# Altium footprint library FOOTPRINT.PcbLib: 132 footprints (part 1 of 9)
Each footprint in its own frame and in the unit in brackets; x right, y up, seen from the top. Pads: shape width x height; smd on the part's side, far side on the other; paste and mask are expansions set on the pad; w line width, h text height; cw(c..) or ccw(c..) is an arc to the next point about the centre after c.
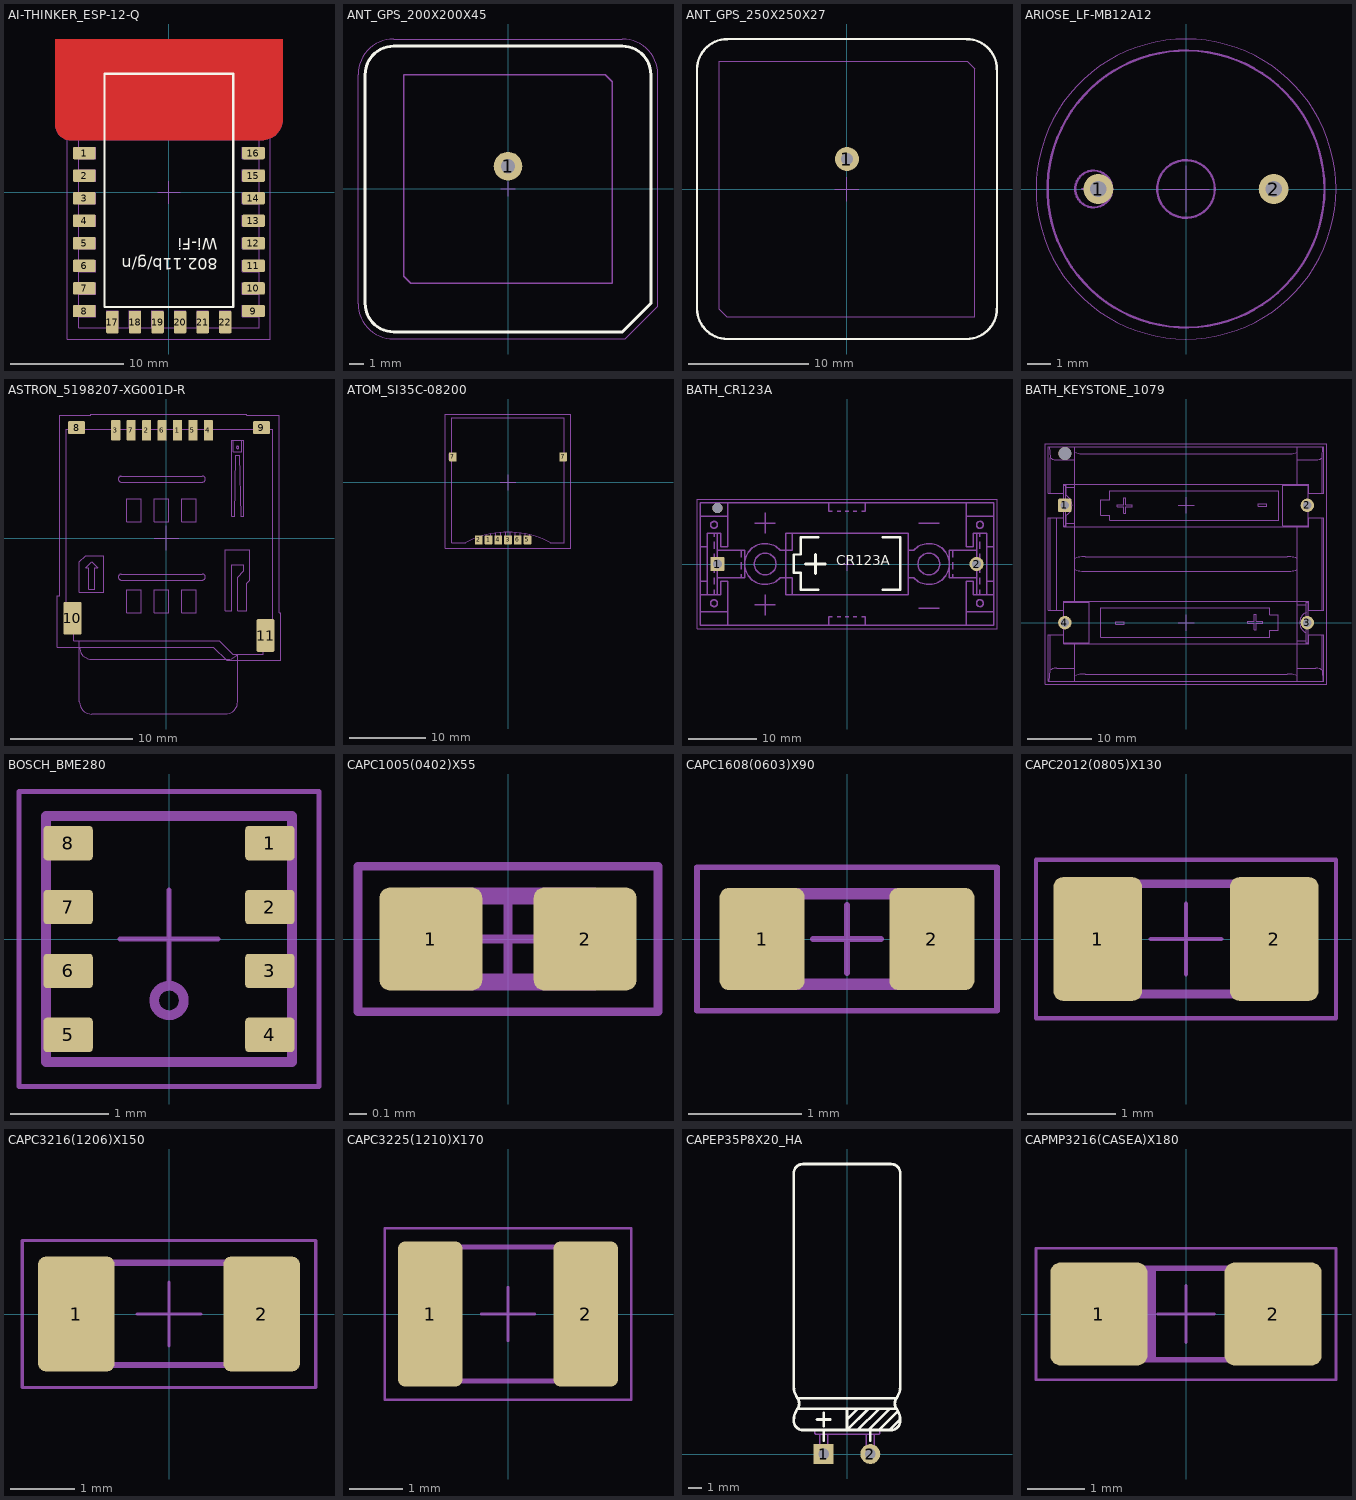
[diagram p0: the footprints below, top view; thin cyan lines are the x and y axes]

## AI-THINKER_ESP-12-Q [mm] "WiFi Module"
height 3.4
pads (22):
  rrect20% 2x1.1 smd: 1(-7.5,3.48) 2(-7.5,1.48) 3(-7.5,-0.52) 4(-7.5,-2.52) 5(-7.5,-4.52) 6(-7.5,-6.52) 7(-7.5,-8.52) 8(-7.5,-10.52) 9(7.5,-10.52) 10(7.5,-8.52) 11(7.5,-6.52) 12(7.5,-4.52) 13(7.5,-2.52) 14(7.5,-0.52) 15(7.5,1.48) 16(7.5,3.48)
  rrect20% 1.1x2 smd: 17(-5,-11.5) 18(-3,-11.5) 19(-1,-11.5) 20(1,-11.5) 21(3,-11.5) 22(5,-11.5)
Top:
  pour cut-out: -10.05,5.937 -10.05,13.587 10.075,13.587 10.075,6.449 10.075,6.27 10.005,5.917 9.867,5.585 9.668,5.286 9.413,5.032 9.114,4.832 8.782,4.695 8.43,4.624 8.25,4.624 -8.737,4.624 -8.867,4.624 -9.12,4.675 -9.359,4.774 -9.574,4.918 -9.757,5.1 -9.901,5.315 -10,5.554 -10.05,5.808
Top Inner 2:
  pour cut-out: -10.05,5.937 -10.05,13.587 10.075,13.587 10.075,6.449 10.075,6.27 10.005,5.917 9.867,5.585 9.668,5.286 9.413,5.032 9.114,4.832 8.782,4.695 8.43,4.624 8.25,4.624 -8.737,4.624 -8.867,4.624 -9.12,4.675 -9.359,4.774 -9.574,4.918 -9.757,5.1 -9.901,5.315 -10,5.554 -10.05,5.808
Top Inner 1:
  pour cut-out: -10.05,5.937 -10.05,13.587 10.075,13.587 10.075,6.449 10.075,6.27 10.005,5.917 9.867,5.585 9.668,5.286 9.413,5.032 9.114,4.832 8.782,4.695 8.43,4.624 8.25,4.624 -8.737,4.624 -8.867,4.624 -9.12,4.675 -9.359,4.774 -9.574,4.918 -9.757,5.1 -9.901,5.315 -10,5.554 -10.05,5.808
Bot Inner 2:
  pour cut-out: -10.05,5.937 -10.05,13.587 10.075,13.587 10.075,6.449 10.075,6.27 10.005,5.917 9.867,5.585 9.668,5.286 9.413,5.032 9.114,4.832 8.782,4.695 8.43,4.624 8.25,4.624 -8.737,4.624 -8.867,4.624 -9.12,4.675 -9.359,4.774 -9.574,4.918 -9.757,5.1 -9.901,5.315 -10,5.554 -10.05,5.808
Bot Inner 1:
  pour cut-out: -10.05,5.937 -10.05,13.587 10.075,13.587 10.075,6.449 10.075,6.27 10.005,5.917 9.867,5.585 9.668,5.286 9.413,5.032 9.114,4.832 8.782,4.695 8.43,4.624 8.25,4.624 -8.737,4.624 -8.867,4.624 -9.12,4.675 -9.359,4.774 -9.574,4.918 -9.757,5.1 -9.901,5.315 -10,5.554 -10.05,5.808
Bot:
  pour cut-out: -10.05,5.937 -10.05,13.587 10.075,13.587 10.075,6.449 10.075,6.27 10.005,5.917 9.867,5.585 9.668,5.286 9.413,5.032 9.114,4.832 8.782,4.695 8.43,4.624 8.25,4.624 -8.737,4.624 -8.867,4.624 -9.12,4.675 -9.359,4.774 -9.574,4.918 -9.757,5.1 -9.901,5.315 -10,5.554 -10.05,5.808
Top Overlay:
  lines w0.2: -5.7,-10.157 -5.7,10.518 5.7,10.518 5.7,-10.157 -5.7,-10.157
  text "802.11b/g/n / Wi-Fi" at 4.35,-3.707 h1.8
Top Assembly:
  lines w0.1: -8,-11.02 -6.5,-11.02 -6.5,-10.02 -8,-10.02 ; -8,-9.02 -6.5,-9.02 -6.5,-8.02 -8,-8.02 ; -8,-7.02 -6.5,-7.02 -6.5,-6.02 -8,-6.02 ; -8,-5.02 -6.5,-5.02 -6.5,-4.02 -8,-4.02 ; -8,-3.02 -6.5,-3.02 -6.5,-2.02 -8,-2.02 ; -8,-1.02 -6.5,-1.02 -6.5,-0.02 -8,-0.02 ; -8,0.98 -6.5,0.98 -6.5,1.98 -8,1.98 ; -8,2.98 -6.5,2.98 -6.5,3.98 -8,3.98 ; -8,5.775 8,5.775 ; -6.1,5.775 -6.1,9.875 -1.9,9.875 -1.9,7.875 -0.1,7.875 -0.1,9.875 2.1,9.875 2.1,7.875 3.9,7.875 3.9,9.875 6.1,9.875 6.1,6.775 5.9,6.775 ; -5.9,5.775 -5.9,9.675 -4.1,9.675 -4.1,5.775 ; -5.5,-12 -5.5,-10.5 -4.5,-10.5 -4.5,-12 ; -3.9,5.775 -3.9,9.675 -2.1,9.675 -2.1,7.675 0.1,7.675 0.1,9.675 1.9,9.675 1.9,7.675 4.1,7.675 4.1,9.675 5.9,9.675 5.9,6.775 ; -3.5,-12 -3.5,-10.5 -2.5,-10.5 -2.5,-12 ; -1.5,-12 -1.5,-10.5 -0.5,-10.5 -0.5,-12 ; 0.5,-12 0.5,-10.5 1.5,-10.5 1.5,-12 ; 2.5,-12 2.5,-10.5 3.5,-10.5 3.5,-12 ; 4.5,-12 4.5,-10.5 5.5,-10.5 5.5,-12 ; 5.3,-12.025 8,-12.025 8,-10.82 cw(c8,-10.52) 8,-10.22 8,-8.82 cw(c8,-8.52) 8,-8.22 8,-6.82 cw(c8,-6.52) 8,-6.22 8,-4.82 cw(c8,-4.52) 8,-4.22 8,-2.82 cw(c8,-2.52) 8,-2.22 8,-0.82 cw(c8,-0.52) 8,-0.22 8,1.18 cw(c8,1.48) 8,1.78 8,3.18 cw(c8,3.48) 8,3.78 8,11.975 -8,11.975 -8,3.78 cw(c-8,3.48) -8,3.18 -8,1.78 cw(c-8,1.48) -8,1.18 -8,-0.22 cw(c-8,-0.52) -8,-0.82 -8,-2.22 cw(c-8,-2.52) -8,-2.82 -8,-4.22 cw(c-8,-4.52) -8,-4.82 -8,-6.22 cw(c-8,-6.52) -8,-6.82 -8,-8.22 cw(c-8,-8.52) -8,-8.82 -8,-10.22 cw(c-8,-10.52) -8,-10.82 -8,-12.025 -5.3,-12.025 -5.3,-12 cw(c-5,-12) -4.7,-12 -3.3,-12 cw(c-3,-12) -2.7,-12 -1.3,-12 cw(c-1,-12) -0.7,-12 0.7,-12 cw(c1,-12) 1.3,-12 2.7,-12 cw(c3,-12) 3.3,-12 4.7,-12 cw(c5,-12) 5.3,-12 ; 8,-11.02 6.5,-11.02 6.5,-10.02 8,-10.02 ; 8,-9.02 6.5,-9.02 6.5,-8.02 8,-8.02 ; 8,-7.02 6.5,-7.02 6.5,-6.02 8,-6.02 ; 8,-5.02 6.5,-5.02 6.5,-4.02 8,-4.02 ; 8,-3.02 6.5,-3.02 6.5,-2.02 8,-2.02 ; 8,-1.02 6.5,-1.02 6.5,-0.02 8,-0.02 ; 8,0.98 6.5,0.98 6.5,1.98 8,1.98 ; 8,2.98 6.5,2.98 6.5,3.98 8,3.98 ; 5.9,6.775 5.9,6.775
Top Courtyard:
  lines w0.05: -9,-13 9,-13 9,12.475 -9,12.475 -9,-13
Top Component Center:
  lines w0.05: -1,0 1,0 ; 0,-1 0,1
Top Designator:
  text "'.Comment'" at -1.425,-0.81 h0.65
  text "'.Designator'" at -1.425,0.351 h0.65
3D body "MOD_ESP-12-Q.x_t": height 3.41, standoff 0.01, extent -8,-12.025 8,11.975

## ANT_GPS_200X200X45 [mm] "GPS-Antenna, Body 20x20mm"
height 4.5
pads (1):
  round 2 hole 1: 1(0,1.6)
Top Overlay:
  lines w0.2: -10,-8 ccw(c-8,-8) -8,-10 8,-10 10,-8 10,8 ccw(c8,8) 8,10 -8,10 ccw(c-8,8) -10,8 -10,-8
Top Assembly:
  lines w0.1: 8,-10 8,-10 ; 8,-10 10,-8 10,8 ccw(c8,8) 8,10 -8,10 ccw(c-8,8) -10,8 -10,-8 ccw(c-8,-8) -8,-10 8,-10 ; -7.3,-6.1 -6.8,-6.6 7.3,-6.6 7.3,7.5 6.8,8 -7.3,8 -7.3,-6.1
Top Courtyard:
  lines w0.05: -10.5,-8.025 ccw(c-8.012,-8.013) -8,-10.5 8.2,-10.5 10.5,-8.2 10.5,8 ccw(c8,8) 8,10.5 -8,10.5 ccw(c-8,8) -10.5,8 -10.5,-8.025
Top Component Center:
  lines w0.05: -0.5,0 0.5,0 ; 0,-0.5 0,0.5
Top Designator:
  text "'.Comment'" at -2.625,-0.502 h0.65
  text "'.Designator'" at -2.625,0.126 h0.65
3D body "ANT-GPS.x_t": height 4.5, standoff -2, extent -10,-10 10,10

## ANT_GPS_250X250X27 [mm] "GPS-Antenna, Body 25x25mm"
height 2.7
pads (1):
  round 2 hole 1: 1(0,2.5)
Top Overlay:
  lines w0.2: -9.975,12.495 ccw(c-9.975,9.975) -12.495,9.975 -12.495,-9.975 ccw(c-9.975,-9.975) -9.975,-12.495 9.975,-12.495 ccw(c9.975,-9.975) 12.495,-9.975 ; -9.975,12.5 9.975,12.5 ; 9.975,12.495 cw(c9.975,9.975) 12.495,9.975 ; 12.5,-9.975 12.5,9.975
Top Assembly:
  lines w0.1: -9.975,12.495 ccw(c-9.975,9.975) -12.495,9.975 -12.495,-9.975 ccw(c-9.975,-9.975) -9.975,-12.495 9.975,-12.495 ccw(c9.975,-9.975) 12.495,-9.975 ; -9.975,12.5 9.975,12.5 ; 9.975,12.495 cw(c9.975,9.975) 12.495,9.975 ; 12.5,-9.975 12.5,9.975 ; -10.65,-10.025 -10.65,10.65 10.025,10.65 10.65,10.025 10.65,-10.65 -10.025,-10.65 -10.65,-10.025
Top Component Center:
  lines w0.05: -1,0 1,0 ; 0,-1 0,1
Top Designator:
  text "'.Designator'" at -2.625,0.126 h0.65
  text "'.Comment'" at -2.625,-0.502 h0.65
3D body "ANT-GPS_250X250X27.x_t": height 2.7, standoff -2, extent -12.5,-12.5 12.5,12.5

## ARIOSE_LF-MB12A12 [mm] "Buzzer, D12mm, H7.5mm, Pitch 7.6mm, Lead D0.6mm"
height 7.5
pads (2):
  round 1.3 hole 0.7: 1(-3.8,0) 2(3.8,0)
Top Assembly:
  circle w0.1: c0,0 r6
  circle w0.1: c0,0 r1.25
  circle w0.1: c-4,0 r0.8
  lines w0.1: -4.5,0 -3.5,0 ; -4,-0.5 -4,0.5
Top Courtyard:
  circle w0.05: c0,0 r6.5
Top Component Center:
  lines w0.05: -1,0 1,0 ; 0,-1 0,1
Top Designator:
  text "'.Comment'" at -1.5,-0.452 h0.65
  text "'.Designator'" at -1.5,0.176 h0.65
3D body "ARIOSE_LF-MB12A12.x_t": height 7.51, standoff -2.49, extent -6,-6 6,6

## ASTRON_5198207-XG001D-R [mm] "Micro SIM SMT Holder"
height 1.75
pads (11):
  rrect20% 0.75x1.7 smd: 1(0.91,8.86) 2(-1.63,8.86) 3(-4.17,8.86) 4(3.45,8.86) 5(2.18,8.86) 6(-0.36,8.86) 7(-2.9,8.86)
  rrect20% 1.4x1.05 smd: 8(-7.39,9.08) 9(7.81,9.08)
  rrect20% 1.5x2.7 smd: 10(-7.72,-6.58) 11(8.14,-8)
Top Assembly:
  circle w0.1: c5.85,7.45 r0.1
  lines w0.1: -7.85,8.95 -7.85,9.15 cw(c-7.65,9.15) -7.45,9.15 -7.35,9.15 cw(c-7.15,9.15) -6.95,9.15 -6.95,8.95 ; -7.15,-9.95 -7.15,-8.45 -7.15,-13.45 ccw(c-6.15,-13.45) -6.15,-14.45 4.85,-14.45 ccw(c4.85,-13.45) 5.85,-13.45 5.85,-9.55 ; -7.15,-8.95 ccw(c-6.15,-8.95) -6.15,-9.95 5.15,-9.95 ; -4.4,8.99 -4.4,9.49 -4,9.49 -4,8.99 ; -3.75,5.1 2.95,5.1 cw(c2.95,4.85) 2.95,4.6 -3.7,4.6 cw(c-3.7,4.85) -3.7,5.1 ; -3.13,8.99 -3.13,9.49 -2.73,9.49 -2.73,8.99 ; -1.86,8.99 -1.86,9.49 -1.46,9.49 -1.46,8.99 ; -0.59,8.99 -0.59,9.49 -0.19,9.49 -0.19,8.99 ; 0.68,8.99 0.68,9.49 1.08,9.49 1.08,8.99 ; 1.95,8.99 1.95,9.49 2.35,9.49 2.35,8.99 ; 3.22,8.99 3.22,9.49 3.62,9.49 3.62,8.99 ; 5.05,-9.95 ccw(c5.05,-8.95) 5.85,-9.55 ; 5.5,8.05 5.5,7.1 6.2,7.1 6.2,8.05 ; 5.85,-9.95 5.85,-9.55 ; 7.35,8.95 7.35,9.15 cw(c7.55,9.15) 7.75,9.15 7.85,9.15 cw(c8.05,9.15) 8.25,9.15 8.25,8.95 ; -8.25,-5.55 -7.6,-5.55 -7.6,-5.95 -8.05,-5.95 -8.05,-7.55 -7.6,-7.55 -7.6,-8.45 4.35,-8.45 5.45,-9.55 7.95,-9.55 7.95,-7.45 8.75,-7.45 8.75,8.95 -8.25,8.95 -8.25,-5.55 ; -7.15,-4.45 -7.15,-1.95 -6.65,-1.45 -5.15,-1.45 -5.15,-4.45 -7.15,-4.45 ; -6.65,-2.45 -6.4,-2.45 -6.4,-4.2 -5.9,-4.2 -5.9,-2.45 -5.65,-2.45 -6.15,-1.95 -6.65,-2.45 ; -3.7,-3.45 cw(c-3.7,-3.2) -3.7,-2.95 2.95,-2.95 cw(c2.95,-3.2) 2.95,-3.45 -3.7,-3.45 ; -3.25,-6.15 -2.05,-6.15 -2.05,-4.25 -3.25,-4.25 -3.25,-6.15 ; -3.25,1.35 -2.05,1.35 -2.05,3.25 -3.25,3.25 -3.25,1.35 ; -1,-6.15 0.2,-6.15 0.2,-4.25 -1,-4.25 -1,-6.15 ; -1,1.35 0.2,1.35 0.2,3.25 -1,3.25 -1,1.35 ; 1.25,-6.15 2.45,-6.15 2.45,-4.25 1.25,-4.25 1.25,-6.15 ; 1.25,1.35 2.45,1.35 2.45,3.25 1.25,3.25 1.25,1.35 ; 4.85,-5.95 5.35,-5.95 5.35,-2.2 6.35,-2.2 6.35,-2.7 5.85,-3.2 5.85,-5.95 6.6,-5.95 6.6,-3.7 6.85,-3.45 6.85,-0.95 4.85,-0.95 4.85,-5.95 ; 5.35,1.8 5.6,1.8 5.7,6.8 6,6.8 6.1,1.8 6.35,1.8 6.35,8.05 5.35,8.05 5.35,1.8 ; 7.95,-9.05 7.95,-7.85 8.55,-7.85 cw(c8.55,-8.05) 8.55,-8.25 8.55,-8.65 cw(c8.55,-8.85) 8.55,-9.05 7.95,-9.05
Top Courtyard:
  lines w0.05: -8.975,-8.95 3.85,-8.95 4.95,-10.05 9.4,-10.05 9.4,-6.15 9.25,-6.15 9.25,10.1 6.6,10.1 6.6,10.2 -6.2,10.2 -6.2,10.1 -8.75,10.1 -8.75,-4.725 -8.975,-4.725 -8.975,-8.95
Top Component Center:
  lines w0.05: -1,0 1,0 ; 0,-1 0,1
Top Designator:
  text "'.Designator'" at -2.625,0.126 h0.65
  text "'.Comment'" at -2.625,-0.502 h0.65
3D body: height 2, standoff 0, extent -8.25,-9.55 8.75,8.95
3D body: height 0.16, standoff 0, extent -4.4,8.95 -4,9.49
3D body: height 0.16, standoff 0, extent -3.13,8.95 -2.73,9.49
3D body: height 0.16, standoff 0, extent -1.86,8.95 -1.46,9.49
3D body: height 0.16, standoff 0, extent -0.59,8.95 -0.19,9.49
3D body: height 0.16, standoff 0, extent 0.68,8.95 1.08,9.49
3D body: height 0.16, standoff 0, extent 1.95,8.95 2.35,9.49
3D body: height 0.16, standoff 0, extent 3.22,8.95 3.62,9.49
3D body: height 0.16, standoff 0, extent -7.85,8.95 -6.95,9.35
3D body: height 0.16, standoff 0, extent 7.35,8.95 8.25,9.35
3D body: height 0.16, standoff 0, extent 7.95,-9.05 8.75,-7.85

## ATOM_SI35C-08200 [mm] "Micro SIM Holder"
pads (8):
  rrect20% 1x1.2 smd: 1(-2.54,-7.5) 2(-3.81,-7.5) 3(0,-7.5) 4(-1.27,-7.5) 5(2.54,-7.5) 6(1.27,-7.5) 7(-7.2,3.35) 7(7.2,3.35)
Top Assembly:
  lines w0.1: -7.33,2.95 -7.65,2.95 -7.65,3.75 -7.33,3.75 ; -4.12,-7.237 -4.12,-7.85 -3.5,-7.85 -3.5,-7.05 ; -2.85,-6.847 -2.85,-7.85 -2.23,-7.85 -2.23,-6.711 ; -1.58,-6.606 -1.58,-7.85 -0.96,-7.85 -0.96,-6.539 ; -0.31,-6.504 -0.31,-7.85 0.31,-7.85 0.31,-6.504 ; 0.96,-6.539 0.96,-7.85 1.58,-7.85 1.58,-6.606 ; 2.23,-6.711 2.23,-7.85 2.85,-7.85 2.85,-6.847 ; 7.33,2.95 7.65,2.95 7.65,3.75 7.33,3.75 ; -7.33,-7.85 -5.5,-7.85 cw(c0,-18.379) 5.5,-7.85 7.33,-7.85 7.33,8.45 -7.33,8.45 -7.33,-7.85
Top Courtyard:
  lines w0.05: -8.2,-8.6 -4.5,-8.6 8.2,-8.6 8.2,3.3 8.2,8.95 -8.2,8.95 -8.2,2.7 -8.2,-8.6
Top Component Center:
  lines w0.05: -1,0 1,0 ; 0,-1 0,1
Top Designator:
  text "'.Comment'" at -1.425,-0.749 h0.65
  text "'.Designator'" at -1.425,0.351 h0.65
3D body: height 0.25, standoff 0, extent 7.33,2.95 7.65,3.75
3D body: height 0.25, standoff 0, extent -7.65,2.95 -7.33,3.75
3D body: height 0.25, standoff 0, extent 2.23,-7.85 2.85,-6.711
3D body: height 0.25, standoff 0, extent 0.96,-7.85 1.58,-6.548
3D body: height 0.25, standoff 0, extent -0.31,-7.85 0.31,-6.504
3D body: height 0.25, standoff 0, extent -1.58,-7.85 -0.96,-6.548
3D body: height 0.25, standoff 0, extent -2.85,-7.85 -2.23,-6.711
3D body: height 0.25, standoff 0, extent -4.12,-7.85 -3.5,-7.05
3D body: height 1.5, standoff 0, extent -7.33,-7.85 7.33,8.45

## BATH_CR123A [mm] "Battery Holder, Body 42.95x18.30mm"
height 14.6
pads (3):
  rrect20% 2.1x2.1 hole 1.3: 1(-19,0)
  round 2.1 hole 1.3: 2(19,0)
  round 1.5 hole 1.5 unplated: ""(-19,8.2)
Top Overlay:
  lines w0.35: -4.2,3.9 -6.8,3.9 -6.8,1.4 -7.8,1.4 -7.8,-1.3 -6.775,-1.3 -6.775,-3.8 -4.175,-3.8 ; 5.2,-3.8 7.8,-3.8 7.8,3.9 5.2,3.9
  lines w0.4: -6.1,0 -3.2,0 ; -4.625,-1.4 -4.625,1.4
  text "CR123A" at -1.6,-0.701 h2.5
Top Assembly:
  circle w0.2: c-19.5,-5.75 r0.5
  circle w0.2: c-19.5,5.75 r0.5
  circle w0.2: c19.5,-5.75 r0.5
  circle w0.2: c19.5,5.75 r0.5
  circle w0.2: c-12,0 r1.6
  circle w0.2: c12,0 r1.6
  lines w0.2: -21.5,-7 -17.5,-7 ; -21.5,-4.5 -20.5,-4.5 ; -21.5,-2.5 -20.5,-2.5 -20.5,-4.5 ; -21.5,2.5 -20.5,2.5 ; -21.5,7 -17.5,7 ; -20.75,2.5 -20.5,2.5 ; -19.5,-4.5 -19.5,-3.75 ; -19.5,-3 -19.5,-2 ; -19.5,-1.25 -19.5,-0.25 ; -19.5,0.5 -19.5,1.5 ; -19.5,2.25 -19.5,3.25 ; -19.5,4 -19.5,4.5 ; -19,-4.5 -19,4.5 ; -19,-2 -15,-2 -15,2 -19,2 ; -17.5,-9 -17.5,-2.5 -18.5,-2.5 -18.5,-4.5 -20.5,-4.5 ; -15.5,-2 -15.5,-1.5 ; -15.5,-0.75 -15.5,0.25 ; -15.5,1 -15.5,2 ; -13.5,-6 -10.5,-6 ; -13.5,6 -10.5,6 ; -12,-7.5 -12,-4.5 ; -12,4.5 -12,7.5 ; -8,-4.5 -8,-2.018 -9,-2.018 -9.78,-2.018 cw(c-12,0) -9.78,2.018 -9,2.018 -8,2.018 -8,4.5 ; -2.65,-9 -2.65,-7.75 -2.15,-7.75 ; -2.65,9 -2.65,7.75 -2.15,7.75 ; -1.45,-7.75 -0.95,-7.75 ; -1.45,7.75 -0.95,7.75 ; -0.25,-7.75 0.25,-7.75 ; -0.25,7.75 0.25,7.75 ; 0.95,-7.75 1.45,-7.75 ; 0.95,7.75 1.45,7.75 ; 2.15,-7.75 2.65,-7.75 2.65,-9 ; 2.15,7.75 2.65,7.75 2.65,9 ; 10.5,-6.5 13.5,-6.5 ; 10.5,6 13.5,6 ; 15.5,-2 15.5,-1.5 ; 15.5,-0.75 15.5,0.25 ; 15.5,1 15.5,2 ; 17.5,-9 17.5,-2.5 18.5,-2.5 18.5,-4.5 20.5,-4.5 ; 17.5,-7 21.5,-7 ; 17.5,7 21.5,7 ; 17.5,9 17.5,2.5 18.5,2.5 18.5,4.5 20.5,4.5 20.5,2.5 ; 19,-4.5 19,4.5 ; 19,-2 15,-2 15,2 19,2 ; 19.5,-4.5 19.5,-3.75 ; 19.5,-3 19.5,-2 ; 19.5,-1.25 19.5,-0.25 ; 19.5,0.5 19.5,1.5 ; 19.5,2.25 19.5,3.25 ; 19.5,4 19.5,4.5 ; 20.5,-2.5 21.5,-2.5 ; 21.5,-4.5 20.5,-4.5 ; 21.5,2.5 20.5,2.5 ; -21.5,9 -21.5,-9 21.5,-9 21.5,9 -21.5,9 ; -21.5,9 -17.5,9 -17.5,2.5 -18.5,2.5 -18.5,4.5 -20.5,4.5 -20.5,2.5 ; -20.5,-4.5 -20.5,2.5 ; 20.5,-4.5 20.5,2.5 ; -9,-4.5 -9,4.5 9,4.5 9,-4.5 -9,-4.5 ; 9,-2.018 9.78,-2.018 ccw(c12,0) 9.78,2.018 9,2.018 9,-2.018
Top Courtyard:
  lines w0.05: -22,-9.5 22,-9.5 22,9.5 21.5,9.5 -22,9.5 -22,9 -22,-9.5
Top Component Center:
  lines w0.05: -1,0 1,0 ; 0,-1 0,1
Top Designator:
  text "'.Comment'" at -1.425,-0.803 h0.65
  text "'.Designator'" at -1.425,0.351 h0.65
3D body "CR123A Holder.x_t": height 14.61, standoff -3.59, extent -21.55,-9.15 21.55,9.15

## BATH_KEYSTONE_1079 [mm] "Battery Holder, 2 batteries, reverse protection, 42.45x36.6mm"
height 15.3
pads (5):
  rrect20% 2.1x2.1 hole 1.3: 1(-18.91,18.29)
  round 2.1 hole 1.3: 2(18.91,18.29) 3(18.91,0) 4(-18.91,0)
  round 2 hole 2 unplated: ""(-18.91,26.39)
Top Assembly:
  lines w0.1: -21.308,-9.144 -21.214,-7.431 ; -21.308,27.432 -21.214,25.719 ; -21.214,-1.905 -21.214,-7.431 ; -21.214,1.905 -21.214,16.383 ; -21.214,20.193 -21.214,25.719 ; -20.199,1.905 -20.199,16.383 ; -19.113,-3.175 -15.132,-3.175 -15.132,3.175 -19.113,3.175 ; -19.113,-1.905 -21.463,-1.905 -21.463,-9.144 21.463,-9.144 21.463,-1.905 19.037,-1.905 ; -19.113,0 -19.342,0 -19.342,0.483 -19.113,0.483 ; -19.113,1.905 -21.463,1.905 -21.463,16.383 -19.113,16.383 ; -19.113,15.113 -18.809,15.113 -18.809,21.463 -19.113,21.463 ; -19.113,18.313 -19.342,18.313 -19.342,18.771 -19.113,18.771 ; -19.113,20.193 -21.463,20.193 -21.463,27.432 21.463,27.432 21.463,20.193 19.038,20.193 ; -18.809,16.383 -18.732,16.383 ; -18.809,16.7 ccw(c-19.546,18.288) -18.809,19.876 ; -18.809,20.193 -18.732,20.193 ; -18.732,-3.302 -18.732,-3.175 ; -18.732,3.175 -18.732,3.302 ; -18.732,14.986 -18.732,16.738 ; -18.732,15.494 -17.335,15.494 ; -18.732,19.838 -18.732,21.59 ; -18.732,21.082 -17.335,21.082 ; -17.335,-9.144 -17.335,-3.175 ; -17.335,-7.112 -20.199,-7.112 ccw(c-20.358,-8.38) -21.214,-7.432 ; -17.335,3.175 -17.335,27.432 ; -17.335,25.4 -20.199,25.4 cw(c-20.358,26.668) -21.214,25.72 ; -17.331,-8.302 cw(c-16.063,-11.144) -15.761,-8.047 15.761,-8.047 cw(c16.063,-11.144) 17.331,-8.302 ; -17.331,8.302 ccw(c-16.063,11.144) -15.761,8.047 15.761,8.047 ccw(c16.063,11.144) 17.331,8.302 ; -17.331,9.986 cw(c-16.063,7.144) -15.761,10.241 15.761,10.241 cw(c16.063,7.144) 17.331,9.986 ; -17.331,26.59 ccw(c-16.063,29.432) -15.761,26.335 15.761,26.335 ccw(c16.063,29.432) 17.331,26.59 ; 17.335,-9.144 17.335,15.113 ; 17.335,-7.112 20.199,-7.112 cw(c20.358,-8.38) 21.214,-7.432 ; 17.335,-2.794 18.732,-2.794 ; 17.335,2.794 18.732,2.794 ; 17.335,21.463 17.335,27.432 ; 17.335,25.4 20.199,25.4 ccw(c20.358,26.668) 21.214,25.72 ; 18.732,-3.302 18.732,3.302 ; 18.732,-3.175 19.037,-3.175 19.037,3.175 18.732,3.175 ; 18.732,-1.587 cw(c19.465,0) 18.732,1.587 ; 18.732,14.986 18.732,15.113 ; 18.732,21.463 18.732,21.59 ; 19.037,0.025 19.266,0.025 19.266,0.483 19.037,0.483 ; 19.037,1.905 21.463,1.905 21.463,16.383 19.038,16.383 ; 19.037,18.313 19.266,18.313 19.266,18.771 19.037,18.771 ; 19.113,-1.905 19.113,-3.302 -19.113,-3.302 -19.113,3.302 19.113,3.302 19.113,1.905 ; 19.113,16.383 19.113,14.986 -19.113,14.986 -19.113,21.59 19.113,21.59 19.113,20.193 ; 21.214,-1.905 21.214,-7.431 ; 21.214,1.905 21.214,16.383 ; 21.214,20.193 21.214,25.719 ; 21.308,-9.144 21.214,-7.431 ; 21.308,27.432 21.214,25.719 ; -13.35,-2.286 13.066,-2.286 13.066,-1.206 14.387,-1.206 14.387,1.206 13.066,1.206 13.066,2.286 -13.35,2.286 -13.35,-2.286 ; -13.35,16.783 -11.928,16.783 -11.928,16.002 14.478,16.002 14.478,20.574 -11.928,20.574 -11.928,19.196 -13.35,19.196 -13.35,16.783 ; -10.978,-0.234 -9.632,-0.234 -9.632,0.125 -10.978,0.125 -10.978,-0.234 ; -10.748,18.099 -9.716,18.099 -9.716,17.067 -9.402,17.067 -9.402,18.099 -8.37,18.099 -8.37,18.413 -9.402,18.413 -9.402,19.445 -9.716,19.445 -9.716,18.413 -10.748,18.413 -10.748,18.099 ; 9.614,-0.071 10.646,-0.071 10.646,-1.103 10.96,-1.103 10.96,-0.071 11.992,-0.071 11.992,0.243 10.96,0.243 10.96,1.275 10.646,1.275 10.646,0.243 9.614,0.243 9.614,-0.071 ; 11.27,18.164 11.27,18.523 12.616,18.523 12.616,18.164 11.27,18.164 ; 15.075,15.113 19.038,15.113 19.038,21.463 15.075,21.463 15.075,15.113
Top Courtyard:
  lines w0.05: -22,-9.65 21.975,-9.65 21.975,9.5 21.975,27.925 -22,27.925 -22,9 -22,-9.65
Top Component Center:
  lines w0.05: -1.25,0 1.25,0 ; -1.25,18.29 1.25,18.29 ; 0,-1.25 0,1.25 ; 0,17.04 0,19.54
3D body "1079.step": height 15.24, standoff -3.55, extent -21.463,-9.144 21.463,27.432

## BOSCH_BME280 [mm] "Bosch LGA, BME280, 8-Leads, Body 2.50x2.50mm"
height 0.93
pads (8):
  rrect20% 0.5x0.35 smd paste-0.025: 1(1.025,0.975) 2(1.025,0.325) 3(1.025,-0.325) 4(1.025,-0.975) 5(-1.025,-0.975) 6(-1.025,-0.325) 7(-1.025,0.325) 8(-1.025,0.975)
Top Assembly:
  circle w0.1: c0,-0.625 r0.15
  lines w0.1: -1.25,-1.25 1.25,-1.25 1.25,1.25 -1.25,1.25 -1.25,-1.25
Top Courtyard:
  lines w0.05: -1.525,-1.5 1.525,-1.5 1.525,1.5 -1.525,1.5 -1.525,-1.5
Top Component Center:
  lines w0.05: -0.5,0 0.5,0 ; 0,-0.5 0,0.5
Top Designator:
  text "'.Comment'" at 0.535,-1.2 h0.65
  text "'.Designator'" at -0.176,-1.2 h0.65
3D body "BOSCH_BME280.x_t": height 0.93, standoff 0, extent -1.25,-1.25 1.25,1.25

## CAPC1005(0402)X55 [mm] "Chip Capacitor, 2-Leads, Body 1.00x0.50mm"
height 0.55
pads (2):
  rrect20% 0.6x0.6 smd: 1(-0.45,0) 2(0.45,0)
Top Assembly:
  lines w0.1: -0.325,-0.25 -0.325,0.25 ; 0.325,-0.25 0.325,0.25 ; -0.5,-0.25 -0.5,0.25 0.5,0.25 0.5,-0.25 -0.5,-0.25
Top Courtyard:
  lines w0.05: -0.875,-0.425 -0.875,0.425 0.875,0.425 0.875,-0.425 -0.875,-0.425
Top Component Center:
  lines w0.05: -0.2,0 0.2,0 ; 0,-0.2 0,0.2
Top Designator:
  text "'.Comment'" at 1,-0.446 h0.55
  text "'.Designator'" at 1,0.075 h0.6
3D body "CAPC-SMD-0402(1005).step": height 0.55, standoff 0, extent -0.5,-0.25 0.5,0.25

## CAPC1608(0603)X90 [mm] "Chip Capacitor, 2-Leads, Body 1.55x0.85mm"
height 0.9
pads (2):
  rrect20% 0.75x0.9 smd: 1(-0.75,0) 2(0.75,0)
Top Assembly:
  lines w0.1: -0.5,-0.4 -0.5,0.4 ; 0.5,-0.4 0.5,0.4 ; -0.8,-0.4 0.8,-0.4 0.8,0.4 -0.8,0.4 -0.8,-0.4
Top Courtyard:
  lines w0.05: -1.325,-0.635 1.325,-0.635 1.325,0.635 -1.325,0.635 -1.325,-0.635
Top Component Center:
  lines w0.05: -0.3,0 0.3,0 ; 0,-0.3 0,0.3
Top Designator:
  text "'.Designator'" at 1,0.026 h0.65
  text "'.Comment'" at 1,-0.503 h0.65
3D body "CAPC-SMD-0603(1608).step": height 0.9, standoff 0, extent -0.8,-0.4 0.8,0.4

## CAPC2012(0805)X130 [mm] "Chip Capacitor, 2-Leads, Body 2.00x1.20mm"
height 1.3
pads (2):
  rrect20% 1x1.4 smd: 1(-1,0) 2(1,0)
Top Assembly:
  lines w0.1: -0.625,-0.625 -0.625,0.625 ; 0.625,-0.625 0.625,0.625 ; -1,-0.625 -1,0.625 1,0.625 1,-0.625 -1,-0.625
Top Courtyard:
  lines w0.05: -1.7,-0.9 -1.7,0.9 1.7,0.9 1.7,-0.9 -1.7,-0.9
Top Component Center:
  lines w0.05: -0.4,0 0.4,0 ; 0,-0.4 0,0.4
Top Designator:
  text "'.Designator'" at -0.5,0.076 h0.65
  text "'.Comment'" at -0.475,-0.503 h0.65
3D body "CAPC-SMD-0805(2012).step": height 1.3, standoff 0, extent -1,-0.625 1,0.625

## CAPC3216(1206)X150 [mm] "Chip Capacitor, 2-Leads, Body 3.20x1.60mm"
height 1.5
pads (2):
  rrect20% 1.2x1.8 smd: 1(-1.45,0) 2(1.45,0)
Top Assembly:
  lines w0.1: -1.15,-0.8 -1.15,0.8 ; 1.15,-0.8 1.15,0.8 ; -1.6,-0.8 -1.6,0.8 1.6,0.8 1.6,-0.8 -1.6,-0.8
Top Courtyard:
  lines w0.05: -2.3,-1.15 2.3,-1.15 2.3,1.15 -2.3,1.15 -2.3,-1.15
Top Component Center:
  lines w0.05: -0.5,0 0.5,0 ; 0,-0.5 0,0.5
Top Designator:
  text "'.Comment'" at -0.45,-0.653 h0.65
  text "'.Designator'" at -0.5,0.076 h0.65
3D body "CAPC-SMD-1206(3216).step": height 1.6, standoff 0, extent -1.6,-0.8 1.6,0.8

## CAPC3225(1210)X170 [mm] "Chip Capacitor, 2-Leads, Body 3.20x2.50mm"
height 1.7
pads (2):
  rrect20% 1.2x2.7 smd: 1(-1.45,0) 2(1.45,0)
Top Assembly:
  lines w0.1: -1.075,-1.25 -1.075,1.25 ; 1.075,-1.25 1.075,1.25 ; -1.6,-1.25 1.6,-1.25 1.6,1.25 -1.6,1.25 -1.6,-1.25
Top Courtyard:
  lines w0.05: -2.3,-1.6 -2.3,1.6 2.3,1.6 2.3,-1.6 -2.3,-1.6
Top Component Center:
  lines w0.05: -0.5,0 0.5,0 ; 0,-0.5 0,0.5
Top Designator:
  text "'.Designator'" at -0.5,0.251 h0.65
  text "'.Comment'" at -0.45,-0.603 h0.65
3D body "CAPC-SMD-1210(3225).step": height 2.5, standoff 0, extent -1.6,-1.25 1.6,1.25

## CAPEP35P8X20_HA [mm] "Capacitor electrolytic polar, D8, H20, Pitch 3.5mm"
height 8
pads (2):
  rect 1.5x1.5 hole 0.8: 1(-1.75,0)
  round 1.5 hole 0.8: 2(1.75,0)
Top Overlay:
  lines w0.2: -2.25,2.6 -1.25,2.6 ; -1.75,1 -1.75,1.8 ; -1.75,2.1 -1.75,3.1 ; 0,2.6 0.798,3.398 ; 0,3.398 0,1.8 1.598,3.398 ; 0.8,1.8 2.398,3.398 ; 1.6,1.8 3.198,3.398 ; 1.75,1 1.75,1.8 ; 2.4,1.8 3.82,3.22 ; 3.2,1.8 4,2.6 ; -3.727,3.398 ccw(c-4.3,3.8) -3.727,4.202 ; -3.727,3.398 ccw(c-2.5,2.535) -4,2.535 -4,2.5 ccw(c-3.3,2.5) -3.3,1.8 3.3,1.8 ccw(c3.3,2.5) 4,2.5 4,2.535 ccw(c2.5,2.535) 3.727,3.398 ; -3.727,3.398 3.727,3.398 ; -3.727,4.202 cw(c-2.5,5.065) -4,5.065 -4,21.1 cw(c-3.3,21.1) -3.3,21.8 3.3,21.8 cw(c3.3,21.1) 4,21.1 4,5.065 cw(c2.5,5.065) 3.727,4.202 ; -3.727,4.202 3.727,4.202 ; 3.727,3.398 cw(c4.3,3.8) 3.727,4.202
Top Assembly:
  lines w0.1: -2.436,1.8 -2.436,1.6 ccw(c-2.336,1.6) -2.336,1.5 2.371,1.5 ; -2.25,2.6 -1.25,2.6 ; -2.05,1.5 -2.05,0 ccw(c-1.75,0) -1.45,0 -1.45,1.5 ; -1.75,2.1 -1.75,3.1 ; 1.45,1.5 1.45,0 ccw(c1.75,0) 2.05,0 2.05,1.5 ; 2.376,1.5 ccw(c2.376,1.6) 2.476,1.6 2.476,1.8 ; -3.727,3.398 ccw(c-4.3,3.8) -3.727,4.202 ; -3.727,3.398 ccw(c-2.5,2.535) -4,2.535 -4,2.5 ccw(c-3.3,2.5) -3.3,1.8 3.3,1.8 ccw(c3.3,2.5) 4,2.5 4,2.535 ccw(c2.5,2.535) 3.727,3.398 ; -3.727,3.398 3.727,3.398 ; -3.727,4.202 cw(c-2.5,5.065) -4,5.065 -4,21.1 cw(c-3.3,21.1) -3.3,21.8 3.3,21.8 cw(c3.3,21.1) 4,21.1 4,5.065 cw(c2.5,5.065) 3.727,4.202 ; -3.727,4.202 3.727,4.202 ; 3.727,3.398 cw(c4.3,3.8) 3.727,4.202
Top Designator:
  text "'.Designator'" at -1.675,12.126 h0.65
  text "'.Comment'" at -1.625,11.451 h0.65
3D body "Cap-EL(8x20-3_5)T HA 3_3Fx3_0V.STEP": height 8, standoff -2.4, extent -4,-0.3 4.002,21.8

## CAPMP3216(CASEA)X180 [mm] "Polarized Molded Capacitor, 2-Leads, Body 3.20x1.80mm"
height 1.8
pads (2):
  rrect20% 1.7x1.8 smd: 1(-1.525,0) 2(1.525,0)
Top Assembly:
  rectangle: -1.05,-0.8 -0.525,0.8
  lines w0.1: -1.45,-0.6 -1.6,-0.6 -1.6,0.6 -1.45,0.6 ; -1.45,-0.6 -1.45,-0.8 1.45,-0.8 1.45,-0.6 ; -1.45,-0.6 -1.45,0.6 ; -1.45,0.6 -1.45,0.8 1.45,0.8 1.45,0.6 ; 1.45,-0.6 1.45,0.6 ; 1.45,-0.6 1.6,-0.6 1.6,0.6 1.45,0.6
Top Courtyard:
  lines w0.05: -2.625,-1.15 2.625,-1.15 2.625,1.15 -2.625,1.15 -2.625,-1.15
Top Component Center:
  lines w0.05: -0.5,0 0.5,0 ; 0,-0.5 0,0.5
Top Designator:
  text "'.Designator'" at -0.5,0.151 h0.65
  text "'.Comment'" at -0.45,-0.524 h0.65
3D body "CP_EIA-3216-18_Kemet-A.step": height 1.8, standoff 0, extent -1.6,-0.8 1.6,0.8